# Altium footprint library Sajad_Altium_Library.PcbLib: 333 footprints (part 3 of 21)
Each footprint in its own frame and in the unit in brackets; x right, y up, seen from the top. Pads: shape width x height; smd on the part's side, far side on the other; paste and mask are expansions set on the pad; w line width, h text height; cw(c..) or ccw(c..) is an arc to the next point about the centre after c.
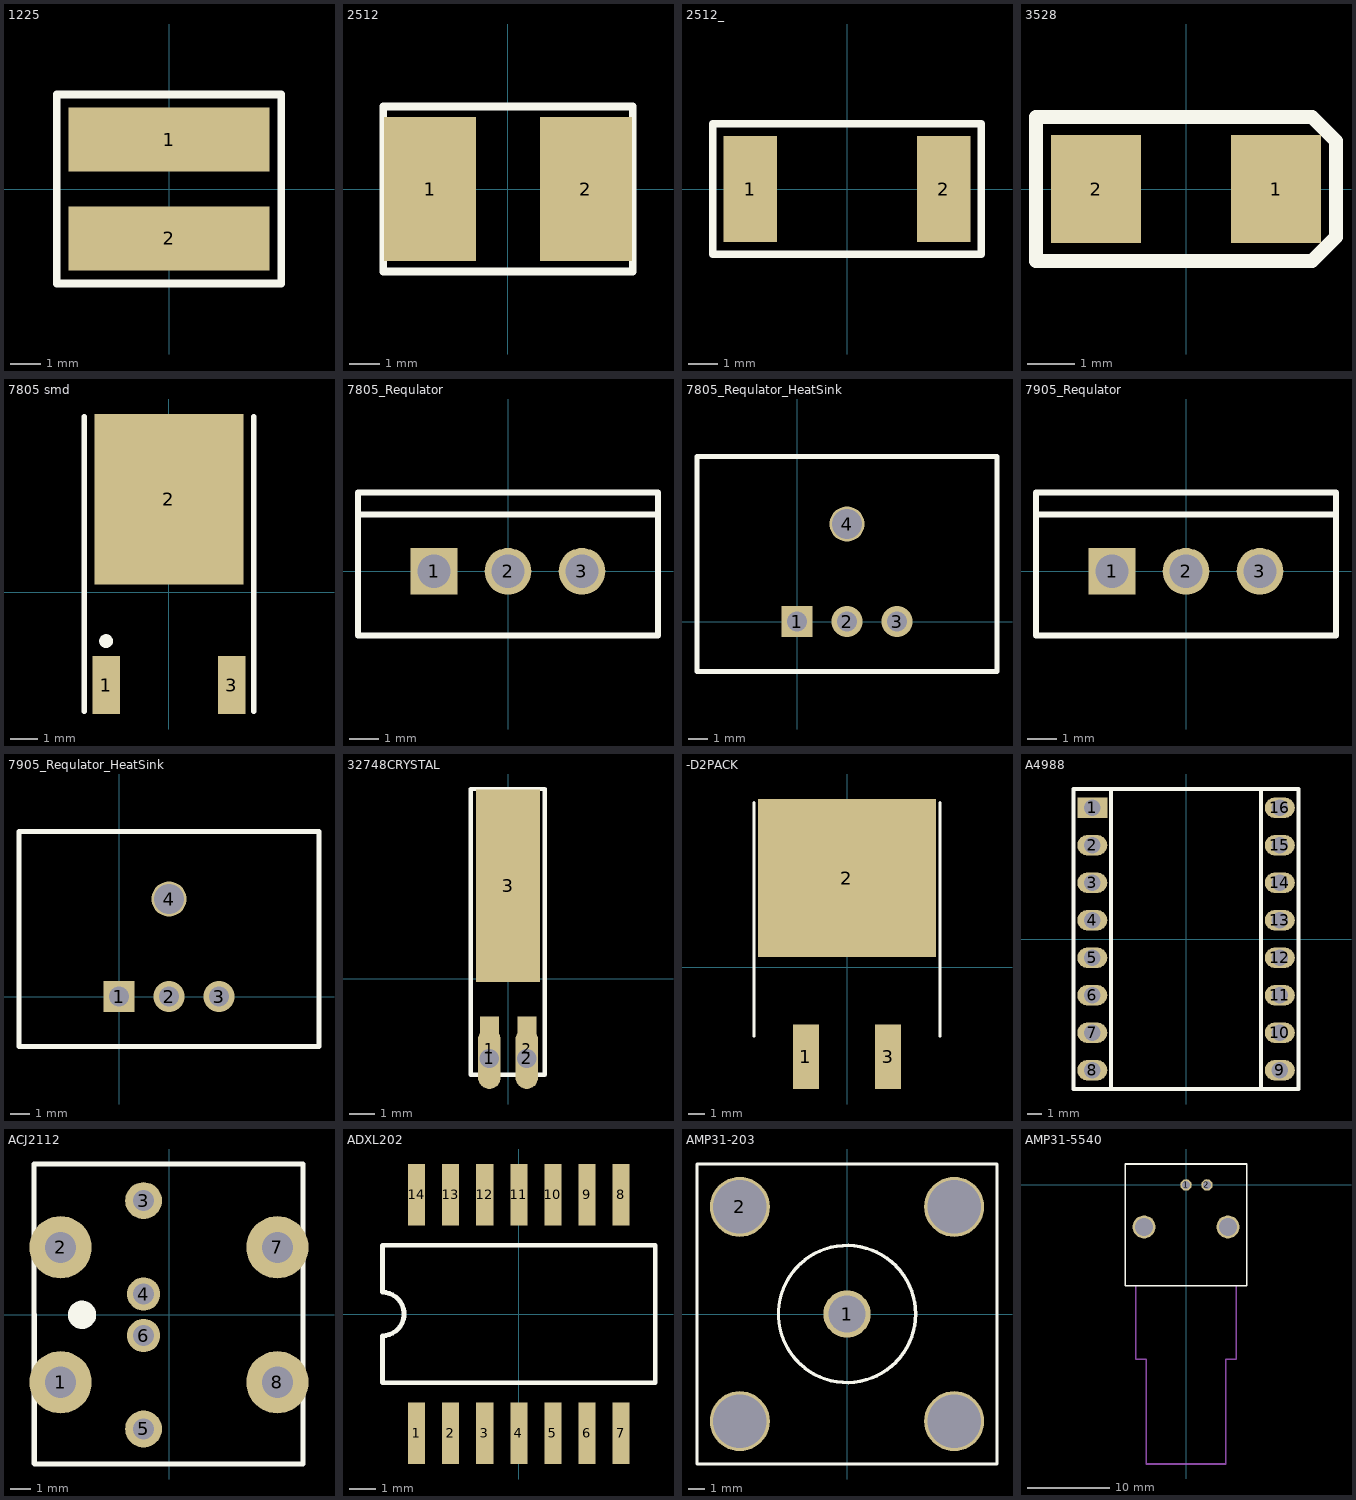
[diagram p2: the footprints below, top view; thin cyan lines are the x and y axes]

## 1225 [mm]
pads (2):
  rect 6.6x2.1 smd: 1(0,1.623) 2(0,-1.623)
Top Overlay:
  lines w0.254: -3.683,-3.1 3.683,-3.1 3.683,3.1 -3.683,3.1 -3.683,-3.1

## 2512 [mm]
pads (2):
  rect 3x4.699 smd: 1(-2.54,0) 2(2.54,0)
Top Overlay:
  lines w0.254: -4.064,-2.692 4.064,-2.692 4.064,2.692 -4.064,2.692 -4.064,-2.692
3D body: height 0.62, standoff 0, extent -3.159,-1.6 3.16,1.6

## 2512_ [mm]
pads (2):
  rect 1.8x3.6 smd: 1(-3.275,0) 2(3.275,0)
Top Overlay:
  lines w0.254: -4.545,-2.2 4.545,-2.2 4.545,2.2 -4.545,2.2 -4.545,-2.2

## 3528 [mil] "Tantalum Capacitor Case B"
pads (2):
  rect 75x90 smd: 1(75,0) 2(-75,0)
Top Overlay:
  lines w12: -125,-60 105,-60 125,-40 125,40 105,60 -125,60 -125,-60
3D body: height 107.81, standoff 25.13, extent -72.65,-55 72.65,56.02

## 7805 smd [mm]
pads (3):
  rect 1x2.1 smd: 1(-2.285,-3.375) 3(2.285,-3.375)
  rect 5.4x6.2 smd: 2(0,3.375)
Top Overlay:
  circle w0.25: c-2.285,-1.775 r0.125
  lines w0.2: -3.085,-4.325 -3.085,6.375 ; 3.085,-4.325 3.085,6.375
3D body: height 2.34, standoff -0.07, extent -3.27,-3.525 3.27,6.414

## 7805_Requlator [mm] "7805 Positive Regulator"
pads (3):
  rect 1.6x1.6 hole 1.143: 1(-2.54,0)
  round 1.6 hole 1.143: 2(0,0) 3(2.54,0)
Top Overlay:
  lines w0.2: -5.15,1.946 5.15,1.946 ; -5.15,-2.2 5.15,-2.2 5.15,2.7 -5.15,2.7 -5.15,-2.2
3D body: height 20.8, standoff -7.98, extent -4.95,-2.159 4.95,2.341

## 7805_Requlator_HeatSink [mil] "7805 Positive Regulator with Heat sink"
pads (4):
  rect 62.99x62.99 hole 40: 1(0,0)
  round 62.99 hole 40: 2(100,0) 3(200,0)
  round 70 hole 60: 4(100,195)
Top Overlay:
  lines w10: -200,-100 -200,195 -200,330 400,330 400,-100 290,-100 -95,-100 -200,-100
3D body: height 818.9, standoff -314.17, extent -94.88,-85 294.88,92.16
3D body: height 984.25, standoff -149.61, extent -190.97,-97.63 390.97,327.63

## 7905_Requlator [mm] "7905 Positive Regulator"
pads (3):
  rect 1.6x1.6 hole 1.143: 1(-2.54,0)
  round 1.6 hole 1.143: 2(0,0) 3(2.54,0)
Top Overlay:
  lines w0.2: -5.15,1.946 5.15,1.946 ; -5.15,-2.2 -5.15,2.7 5.15,2.7 5.15,-2.2 -5.15,-2.2
3D body: height 20.8, standoff -7.98, extent -4.95,-2.159 4.95,2.341

## 7905_Requlator_HeatSink [mil] "7905 Positive Regulator with Heat sink"
pads (4):
  rect 62.99x62.99 hole 40: 1(0,0)
  round 62.99 hole 40: 2(100,0) 3(200,0)
  round 70 hole 60: 4(100,195)
Top Overlay:
  lines w10: -200,-100 -200,195 -200,330 400,330 400,-100 290,-100 -95,-100 -200,-100
3D body: height 818.9, standoff -314.17, extent -94.88,-85 294.88,92.16
3D body: height 984.25, standoff -149.61, extent -190.97,-97.63 390.97,327.63

## 32748CRYSTAL [mil] "32748CRYSTAL"
pads (5):
  oval 35x95 hole 30: 1(-29.62,-124.5) 2(28.62,-124.5)
  rect 29.53x100 smd: 1(-29.62,-109.5) 2(28.62,-109.5)
  rect 100x300 smd: 3(-0.62,144.5)
Top Overlay:
  lines w7: -58.62,-149.5 56.38,-149.5 56.38,295 -58.62,295 -58.62,-149.5
3D body: height 125.98, standoff 0, extent -67.92,-138.43 67.91,285.79

## -D2PACK [mm]
pads (3):
  rect 1.6x4 smd: 1(-2.54,-5.519) 3(2.54,-5.519)
  rect 11x9.75 smd: 2(0,5.519)
Top Overlay:
  lines w0.178: -5.746,-4.262 -5.746,10.188 ; 5.746,-4.262 5.746,10.188
3D body: height 5.18, standoff 0.38, extent -5,-6.311 5,9.359

## A4988 [mil] "Stepper Motor Driver"
pads (16):
  rect 80x55 hole 45: 1(-250,350)
  oval 80x55 hole 45: 2(-250,250) 3(-250,150) 4(-250,50) 5(-250,-50) 6(-250,-150) 7(-250,-250) 8(-250,-350) 9(250,-350) 10(250,-250) 11(250,-150) 12(250,-50) 13(250,50) 14(250,150) 15(250,250) 16(250,350)
Top Overlay:
  lines w10: -200,-400 200,-400 ; -200,-400 -200,400 ; -200,-400 -300,-400 -300,400 -200,400 ; -200,400 200,400 ; 200,-400 200,400 ; 200,-400 300,-400 300,400 200,400
3D body: height 100, standoff -300, extent -299.99,-400 300.01,400

## ACJ2112 [mm]
pads (8):
  round 3 hole 1.5: 1(-5.225,-3.25) 2(-5.225,3.25) 7(5.225,3.25) 8(5.225,-3.25)
  round 1.778 hole 1: 3(-1.225,5.5) 5(-1.225,-5.5)
  round 1.6 hole 1: 4(-1.225,1) 6(-1.225,-1)
Top Overlay:
  circle w0.762: c-4.192,0 r0.3
  lines w0.254: -6.502,7.264 6.452,7.264 6.452,-7.188 ; -6.502,7.264 -6.495,-7.163 -6.502,7.264 ; 6.452,-7.188 -6.477,-7.187 6.452,-7.188
3D body: height 15.24, standoff 0, extent -6.827,-7.315 6.827,7.391

## ADXL202 [mil] "Accelerometers with Digital Output"
pads (14):
  rect 25x90 smd: 1(-150,-175) 2(-100,-175) 3(-50,-175) 4(0,-175) 5(50,-175) 6(100,-175) 7(150,-175) 8(150,175) 9(100,175) 10(50,175) 11(0,175) 12(-50,175) 13(-100,175) 14(-150,175)
Top Overlay:
  lines w7: -200,-101 -200,-31.78 ccw(c-200,0) -200,31.78 -200,101 200,101 200,0 200,-101 -200,-101

## AMP31-203 [mil]
pads (5):
  round 110 hole 86: 1(0,0)
  round 140 hole 125: 2(-250,250) ""(-250,-250) ""(250,-250) ""(250,250)
Top Overlay:
  circle w8: c0,0 r160
  lines w8: -350,-350 350,-350 350,350 -350,350 -350,-350

## AMP31-5540 [mil]
pads (4):
  round 55 hole 38: 1(0,0) 2(100,0)
  round 110 hole 86: ""(-200,-200) ""(200,-200)
Top Overlay:
  lines w8: -290,-480 -290,100 290,100 290,-480 -290,-480
Mechanical 1:
  lines w8: -240,-480 -240,-830 -190,-830 -190,-1330 190,-1330 190,-830 240,-830 240,-480